# Altium footprint library 全库.PcbLib: 967 footprints (part 16 of 61)
Each footprint in its own frame and in the unit in brackets; x right, y up, seen from the top. Pads: shape width x height; smd on the part's side, far side on the other; paste and mask are expansions set on the pad; w line width, h text height; cw(c..) or ccw(c..) is an arc to the next point about the centre after c.
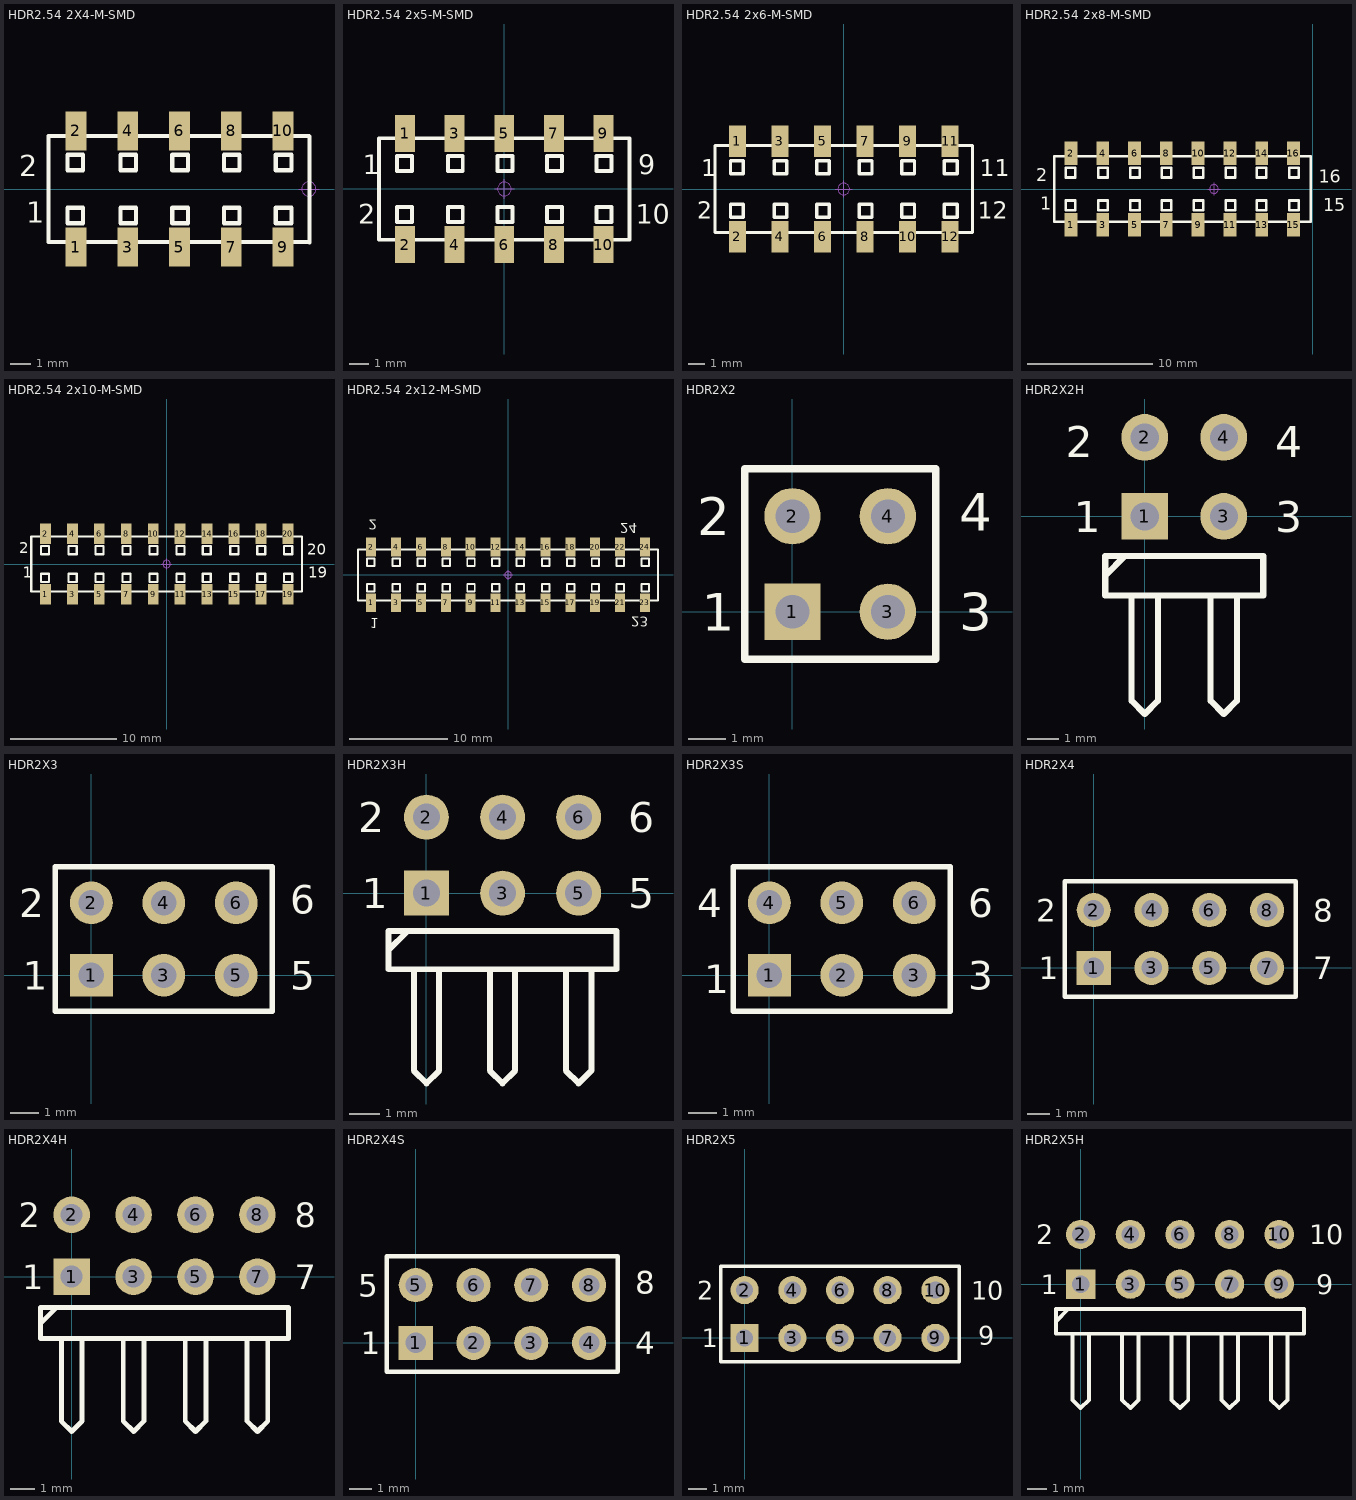
[diagram p15: the footprints below, top view; thin cyan lines are the x and y axes]

## HDR2.54 2X4-M-SMD [mm]
pads (10):
  rect 1.02x1.9 smd: 1(-19.304,-2.85) 2(-19.304,2.85) 3(-16.764,-2.85) 4(-16.764,2.85) 5(-14.224,-2.85) 6(-14.224,2.85) 7(-11.684,-2.85) 8(-11.684,2.85) 9(-9.144,-2.85) 10(-9.144,2.85)
Top Overlay:
  lines w0.2: -7.874,-2.6 -20.644,-2.6 -20.644,2.6 -7.874,2.6 ; -7.842,-2.625 -7.842,2.575 ; -19.715,-1.681 -19.715,-0.919 -18.953,-0.919 -18.953,-1.681 -19.715,-1.681 ; -19.715,0.919 -19.715,1.681 -18.953,1.681 -18.953,0.919 -19.715,0.919 ; -17.115,-1.681 -17.115,-0.919 -16.353,-0.919 -16.353,-1.681 -17.115,-1.681 ; -17.115,0.919 -17.115,1.681 -16.353,1.681 -16.353,0.919 -17.115,0.919 ; -14.575,-1.681 -13.813,-1.681 -13.813,-0.919 -14.575,-0.919 -14.575,-1.681 ; -14.575,0.919 -13.813,0.919 -13.813,1.681 -14.575,1.681 -14.575,0.919 ; -12.035,-1.681 -12.035,-0.919 -11.273,-0.919 -11.273,-1.681 -12.035,-1.681 ; -12.035,0.919 -12.035,1.681 -11.273,1.681 -11.273,0.919 -12.035,0.919 ; -9.495,-1.681 -9.495,-0.919 -8.733,-0.919 -8.733,-1.681 -9.495,-1.681 ; -9.495,0.919 -9.495,1.681 -8.733,1.681 -8.733,0.919 -9.495,0.919
  text "1" at -21.748,-1.665 h1.02
  text "2" at -22.098,0.635 h1.02
Mechanical 15:
  circle w0.05: c-7.874,0 r0.35
  lines w0.05: -8.374,0 -7.374,0 ; -7.874,-0.5 -7.874,0.5
3D body "HDR2.54 2x1P_M.STEP": height 5.15, standoff 0, extent -15.524,-3.2 -12.924,3.2
3D body "HDR2.54 2x1P_M.STEP": height 5.15, standoff 0, extent -18.064,-3.2 -15.464,3.2
3D body "HDR2.54 2x1P_M.STEP": height 5.15, standoff 0, extent -20.604,-3.2 -18.004,3.2
3D body "HDR2.54 2x1P_M.STEP": height 5.15, standoff 0, extent -12.984,-3.2 -10.384,3.2
3D body "HDR2.54 2x1P_M.STEP": height 5.15, standoff 0, extent -10.444,-3.2 -7.844,3.2

## HDR2.54 2x5-M-SMD [mm] "脚距：2.54mm，贴片双排母"
pads (10):
  rect 1.02x1.9 smd: 1(-5.08,2.85) 2(-5.08,-2.85) 3(-2.54,2.85) 4(-2.54,-2.85) 5(0,2.85) 6(0,-2.85) 7(2.54,2.85) 8(2.54,-2.85) 9(5.08,2.85) 10(5.08,-2.85)
Top Overlay:
  lines w0.2: -6.42,-2.6 -6.42,2.6 6.41,2.6 6.41,-2.6 -6.42,-2.6 ; -5.491,-1.681 -4.729,-1.681 -4.729,-0.919 -5.491,-0.919 -5.491,-1.681 ; -5.491,0.919 -4.729,0.919 -4.729,1.681 -5.491,1.681 -5.491,0.919 ; -2.891,-1.681 -2.129,-1.681 -2.129,-0.919 -2.891,-0.919 -2.891,-1.681 ; -2.891,0.919 -2.129,0.919 -2.129,1.681 -2.891,1.681 -2.891,0.919 ; -0.351,-1.681 -0.351,-0.919 0.411,-0.919 0.411,-1.681 -0.351,-1.681 ; -0.351,0.919 -0.351,1.681 0.411,1.681 0.411,0.919 -0.351,0.919 ; 2.189,-1.681 2.951,-1.681 2.951,-0.919 2.189,-0.919 2.189,-1.681 ; 2.189,0.919 2.951,0.919 2.951,1.681 2.189,1.681 2.189,0.919 ; 4.729,-1.681 5.491,-1.681 5.491,-0.919 4.729,-0.919 4.729,-1.681 ; 4.729,0.919 5.491,0.919 5.491,1.681 4.729,1.681 4.729,0.919
  text "10" at 6.731,-1.778 h1.02
  text "9" at 6.858,0.762 h1.02
  text "2" at -7.493,-1.778 h1.02
  text "1" at -7.239,0.762 h1.02
Mechanical 15:
  circle w0.05: c0,0 r0.35
  lines w0.05: -0.5,0 0.5,0 ; 0,-0.5 0,0.5
3D body "HDR2.54 2x1P_M.STEP": height 5.15, standoff 0, extent 3.78,-3.2 6.38,3.2
3D body "HDR2.54 2x1P_M.STEP": height 5.15, standoff 0, extent 1.24,-3.2 3.84,3.2
3D body "HDR2.54 2x1P_M.STEP": height 5.15, standoff 0, extent -6.38,-3.2 -3.78,3.2
3D body "HDR2.54 2x1P_M.STEP": height 5.15, standoff 0, extent -3.84,-3.2 -1.24,3.2
3D body "HDR2.54 2x1P_M.STEP": height 5.15, standoff 0, extent -1.3,-3.2 1.3,3.2

## HDR2.54 2x6-M-SMD [mm] "脚距：2.54mm，贴片双排母"
pads (12):
  rect 1.02x1.9 smd: 1(-6.35,2.85) 2(-6.35,-2.85) 3(-3.81,2.85) 4(-3.81,-2.85) 5(-1.27,2.85) 6(-1.27,-2.85) 7(1.27,2.85) 8(1.27,-2.85) 9(3.81,2.85) 10(3.81,-2.85) 11(6.35,2.85) 12(6.35,-2.85)
Top Overlay:
  lines w0.2: -7.69,-2.6 -7.69,2.6 7.68,2.6 7.68,-2.6 -7.69,-2.6 ; -6.761,-1.681 -6.761,-0.919 -5.999,-0.919 -5.999,-1.681 -6.761,-1.681 ; -6.761,0.919 -6.761,1.681 -5.999,1.681 -5.999,0.919 -6.761,0.919 ; -4.161,-1.681 -4.161,-0.919 -3.399,-0.919 -3.399,-1.681 -4.161,-1.681 ; -4.161,0.919 -4.161,1.681 -3.399,1.681 -3.399,0.919 -4.161,0.919 ; -1.621,-1.681 -0.859,-1.681 -0.859,-0.919 -1.621,-0.919 -1.621,-1.681 ; -1.621,0.919 -0.859,0.919 -0.859,1.681 -1.621,1.681 -1.621,0.919 ; 0.919,-1.681 0.919,-0.919 1.681,-0.919 1.681,-1.681 0.919,-1.681 ; 0.919,0.919 0.919,1.681 1.681,1.681 1.681,0.919 0.919,0.919 ; 3.459,-1.681 3.459,-0.919 4.221,-0.919 4.221,-1.681 3.459,-1.681 ; 3.459,0.919 3.459,1.681 4.221,1.681 4.221,0.919 3.459,0.919 ; 5.999,-1.681 5.999,-0.919 6.761,-0.919 6.761,-1.681 5.999,-1.681 ; 5.999,0.919 5.999,1.681 6.761,1.681 6.761,0.919 5.999,0.919
  text "12" at 8.001,-1.778 h1.02
  text "11" at 8.128,0.762 h1.02
  text "1" at -8.509,0.762 h1.02
  text "2" at -8.763,-1.778 h1.02
Mechanical 15:
  circle w0.05: c0,0 r0.35
  lines w0.05: -0.5,0 0.5,0 ; 0,-0.5 0,0.5
3D body "HDR2.54 2x1P_M.STEP": height 5.15, standoff 0, extent -2.57,-3.2 0.03,3.2
3D body "HDR2.54 2x1P_M.STEP": height 5.15, standoff 0, extent -5.11,-3.2 -2.51,3.2
3D body "HDR2.54 2x1P_M.STEP": height 5.15, standoff 0, extent -7.65,-3.2 -5.05,3.2
3D body "HDR2.54 2x1P_M.STEP": height 5.15, standoff 0, extent -0.03,-3.2 2.57,3.2
3D body "HDR2.54 2x1P_M.STEP": height 5.15, standoff 0, extent 2.51,-3.2 5.11,3.2
3D body "HDR2.54 2x1P_M.STEP": height 5.15, standoff 0, extent 5.05,-3.2 7.65,3.2

## HDR2.54 2x8-M-SMD [mm]
pads (16):
  rect 1.02x1.9 smd: 1(-19.304,-2.85) 2(-19.304,2.85) 3(-16.764,-2.85) 4(-16.764,2.85) 5(-14.224,-2.85) 6(-14.224,2.85) 7(-11.684,-2.85) 8(-11.684,2.85) 9(-9.144,-2.85) 10(-9.144,2.85) 11(-6.604,-2.85) 12(-6.604,2.85) 13(-4.064,-2.85) 14(-4.064,2.85) 15(-1.524,-2.85) 16(-1.524,2.85)
Top Overlay:
  lines w0.2: -20.644,-2.6 -20.644,2.6 -0.127,2.6 -0.127,-2.6 -20.644,-2.6 ; -19.715,-1.681 -18.953,-1.681 -18.953,-0.919 -19.715,-0.919 -19.715,-1.681 ; -19.715,0.919 -18.953,0.919 -18.953,1.681 -19.715,1.681 -19.715,0.919 ; -17.115,-1.681 -16.353,-1.681 -16.353,-0.919 -17.115,-0.919 -17.115,-1.681 ; -17.115,0.919 -16.353,0.919 -16.353,1.681 -17.115,1.681 -17.115,0.919 ; -14.575,-1.681 -14.575,-0.919 -13.813,-0.919 -13.813,-1.681 -14.575,-1.681 ; -14.575,0.919 -14.575,1.681 -13.813,1.681 -13.813,0.919 -14.575,0.919 ; -12.035,-1.681 -11.273,-1.681 -11.273,-0.919 -12.035,-0.919 -12.035,-1.681 ; -12.035,0.919 -11.273,0.919 -11.273,1.681 -12.035,1.681 -12.035,0.919 ; -9.495,-1.681 -8.733,-1.681 -8.733,-0.919 -9.495,-0.919 -9.495,-1.681 ; -9.495,0.919 -8.733,0.919 -8.733,1.681 -9.495,1.681 -9.495,0.919 ; -6.955,-1.681 -6.193,-1.681 -6.193,-0.919 -6.955,-0.919 -6.955,-1.681 ; -6.955,0.919 -6.193,0.919 -6.193,1.681 -6.955,1.681 -6.955,0.919 ; -4.475,-1.681 -4.475,-0.919 -3.713,-0.919 -3.713,-1.681 -4.475,-1.681 ; -4.475,0.919 -4.475,1.681 -3.713,1.681 -3.713,0.919 -4.475,0.919 ; -1.875,-1.681 -1.875,-0.919 -1.113,-0.919 -1.113,-1.681 -1.875,-1.681 ; -1.875,0.919 -1.875,1.681 -1.113,1.681 -1.113,0.919 -1.875,0.919
  text "15" at 0.858,-1.792 h1.02
  text "16" at 0.508,0.508 h1.02
  text "2" at -22.098,0.635 h1.02
  text "1" at -21.748,-1.665 h1.02
Mechanical 15:
  circle w0.05: c-7.874,0 r0.35
  lines w0.05: -8.374,0 -7.374,0 ; -7.874,-0.5 -7.874,0.5
3D body "HDR2.54 2x1P_M.STEP": height 5.15, standoff 0, extent -2.824,-3.2 -0.224,3.2
3D body "HDR2.54 2x1P_M.STEP": height 5.15, standoff 0, extent -5.364,-3.2 -2.764,3.2
3D body "HDR2.54 2x1P_M.STEP": height 5.15, standoff 0, extent -7.904,-3.2 -5.304,3.2
3D body "HDR2.54 2x1P_M.STEP": height 5.15, standoff 0, extent -10.444,-3.2 -7.844,3.2
3D body "HDR2.54 2x1P_M.STEP": height 5.15, standoff 0, extent -12.984,-3.2 -10.384,3.2
3D body "HDR2.54 2x1P_M.STEP": height 5.15, standoff 0, extent -20.604,-3.2 -18.004,3.2
3D body "HDR2.54 2x1P_M.STEP": height 5.15, standoff 0, extent -18.064,-3.2 -15.464,3.2
3D body "HDR2.54 2x1P_M.STEP": height 5.15, standoff 0, extent -15.524,-3.2 -12.924,3.2

## HDR2.54 2x10-M-SMD [mm] "脚距：2.54mm，贴片双排母"
pads (20):
  rect 1.02x1.9 smd: 1(-11.43,-2.85) 2(-11.43,2.85) 3(-8.89,-2.85) 4(-8.89,2.85) 5(-6.35,-2.85) 6(-6.35,2.85) 7(-3.81,-2.85) 8(-3.81,2.85) 9(-1.27,-2.85) 10(-1.27,2.85) 11(1.27,-2.85) 12(1.27,2.85) 13(3.81,-2.85) 14(3.81,2.85) 15(6.35,-2.85) 16(6.35,2.85) 17(8.89,-2.85) 18(8.89,2.85) 19(11.43,-2.85) 20(11.43,2.85)
Top Overlay:
  lines w0.2: -12.77,-2.6 -12.77,2.6 12.76,2.6 12.76,-2.6 -12.77,-2.6 ; -11.841,-1.681 -11.079,-1.681 -11.079,-0.919 -11.841,-0.919 -11.841,-1.681 ; -11.841,0.919 -11.079,0.919 -11.079,1.681 -11.841,1.681 -11.841,0.919 ; -9.241,-1.681 -8.479,-1.681 -8.479,-0.919 -9.241,-0.919 -9.241,-1.681 ; -9.241,0.919 -8.479,0.919 -8.479,1.681 -9.241,1.681 -9.241,0.919 ; -6.701,-1.681 -6.701,-0.919 -5.939,-0.919 -5.939,-1.681 -6.701,-1.681 ; -6.701,0.919 -6.701,1.681 -5.939,1.681 -5.939,0.919 -6.701,0.919 ; -4.161,-1.681 -3.399,-1.681 -3.399,-0.919 -4.161,-0.919 -4.161,-1.681 ; -4.161,0.919 -3.399,0.919 -3.399,1.681 -4.161,1.681 -4.161,0.919 ; -1.621,-1.681 -0.859,-1.681 -0.859,-0.919 -1.621,-0.919 -1.621,-1.681 ; -1.621,0.919 -0.859,0.919 -0.859,1.681 -1.621,1.681 -1.621,0.919 ; 0.919,-1.681 1.681,-1.681 1.681,-0.919 0.919,-0.919 0.919,-1.681 ; 0.919,0.919 1.681,0.919 1.681,1.681 0.919,1.681 0.919,0.919 ; 3.399,-1.681 3.399,-0.919 4.161,-0.919 4.161,-1.681 3.399,-1.681 ; 3.399,0.919 3.399,1.681 4.161,1.681 4.161,0.919 3.399,0.919 ; 5.999,-1.681 5.999,-0.919 6.761,-0.919 6.761,-1.681 5.999,-1.681 ; 5.999,0.919 5.999,1.681 6.761,1.681 6.761,0.919 5.999,0.919 ; 8.539,-1.681 9.301,-1.681 9.301,-0.919 8.539,-0.919 8.539,-1.681 ; 8.539,0.919 9.301,0.919 9.301,1.681 8.539,1.681 8.539,0.919 ; 11.079,-1.681 11.079,-0.919 11.841,-0.919 11.841,-1.681 11.079,-1.681 ; 11.079,0.919 11.079,1.681 11.841,1.681 11.841,0.919 11.079,0.919
  text "2" at -13.925,1 h1.02
  text "1" at -13.575,-1.3 h1.02
  text "19" at 13.35,-1.3 h1.02
  text "20" at 13.25,0.85 h1.02
Mechanical 15:
  circle w0.05: c0,0 r0.35
  lines w0.05: -0.5,0 0.5,0 ; 0,-0.5 0,0.5
3D body "HDR2.54 2x1P_M.STEP": height 5.15, standoff 0, extent 10.13,-3.2 12.73,3.2
3D body "HDR2.54 2x1P_M.STEP": height 5.15, standoff 0, extent 7.59,-3.2 10.19,3.2
3D body "HDR2.54 2x1P_M.STEP": height 5.15, standoff 0, extent 5.05,-3.2 7.65,3.2
3D body "HDR2.54 2x1P_M.STEP": height 5.15, standoff 0, extent 2.51,-3.2 5.11,3.2
3D body "HDR2.54 2x1P_M.STEP": height 5.15, standoff 0, extent -0.03,-3.2 2.57,3.2
3D body "HDR2.54 2x1P_M.STEP": height 5.15, standoff 0, extent -2.57,-3.2 0.03,3.2
3D body "HDR2.54 2x1P_M.STEP": height 5.15, standoff 0, extent -5.11,-3.2 -2.51,3.2
3D body "HDR2.54 2x1P_M.STEP": height 5.15, standoff 0, extent -12.73,-3.2 -10.13,3.2
3D body "HDR2.54 2x1P_M.STEP": height 5.15, standoff 0, extent -10.19,-3.2 -7.59,3.2
3D body "HDR2.54 2x1P_M.STEP": height 5.15, standoff 0, extent -7.65,-3.2 -5.05,3.2

## HDR2.54 2x12-M-SMD [mm] "脚距：2.54mm，贴片双排母"
pads (24):
  rect 1.02x1.9 smd: 1(-13.97,-2.85) 2(-13.97,2.85) 3(-11.43,-2.85) 4(-11.43,2.85) 5(-8.89,-2.85) 6(-8.89,2.85) 7(-6.35,-2.85) 8(-6.35,2.85) 9(-3.81,-2.85) 10(-3.81,2.85) 11(-1.27,-2.85) 12(-1.27,2.85) 13(1.27,-2.85) 14(1.27,2.85) 15(3.81,-2.85) 16(3.81,2.85) 17(6.35,-2.85) 18(6.35,2.85) 19(8.89,-2.85) 20(8.89,2.85) 21(11.43,-2.85) 22(11.43,2.85) 23(13.97,-2.85) 24(13.97,2.85)
Top Overlay:
  lines w0.2: -15.31,-2.6 -15.31,2.6 15.3,2.6 15.3,-2.6 -15.31,-2.6 ; -14.381,-1.681 -13.619,-1.681 -13.619,-0.919 -14.381,-0.919 -14.381,-1.681 ; -14.381,0.919 -13.619,0.919 -13.619,1.681 -14.381,1.681 -14.381,0.919 ; -11.781,-1.681 -11.019,-1.681 -11.019,-0.919 -11.781,-0.919 -11.781,-1.681 ; -11.781,0.919 -11.019,0.919 -11.019,1.681 -11.781,1.681 -11.781,0.919 ; -9.241,-1.681 -9.241,-0.919 -8.479,-0.919 -8.479,-1.681 -9.241,-1.681 ; -9.241,0.919 -9.241,1.681 -8.479,1.681 -8.479,0.919 -9.241,0.919 ; -6.701,-1.681 -5.939,-1.681 -5.939,-0.919 -6.701,-0.919 -6.701,-1.681 ; -6.701,0.919 -5.939,0.919 -5.939,1.681 -6.701,1.681 -6.701,0.919 ; -4.161,-1.681 -3.399,-1.681 -3.399,-0.919 -4.161,-0.919 -4.161,-1.681 ; -4.161,0.919 -3.399,0.919 -3.399,1.681 -4.161,1.681 -4.161,0.919 ; -1.621,-1.681 -0.859,-1.681 -0.859,-0.919 -1.621,-0.919 -1.621,-1.681 ; -1.621,0.919 -0.859,0.919 -0.859,1.681 -1.621,1.681 -1.621,0.919 ; 0.859,-1.681 0.859,-0.919 1.621,-0.919 1.621,-1.681 0.859,-1.681 ; 0.859,0.919 0.859,1.681 1.621,1.681 1.621,0.919 0.859,0.919 ; 3.459,-1.681 3.459,-0.919 4.221,-0.919 4.221,-1.681 3.459,-1.681 ; 3.459,0.919 3.459,1.681 4.221,1.681 4.221,0.919 3.459,0.919 ; 5.999,-1.681 6.761,-1.681 6.761,-0.919 5.999,-0.919 5.999,-1.681 ; 5.999,0.919 6.761,0.919 6.761,1.681 5.999,1.681 5.999,0.919 ; 8.539,-1.681 8.539,-0.919 9.301,-0.919 9.301,-1.681 8.539,-1.681 ; 8.539,0.919 8.539,1.681 9.301,1.681 9.301,0.919 8.539,0.919 ; 11.079,-1.681 11.079,-0.919 11.841,-0.919 11.841,-1.681 11.079,-1.681 ; 11.079,0.919 11.079,1.681 11.841,1.681 11.841,0.919 11.079,0.919 ; 13.619,-1.681 13.619,-0.919 14.381,-0.919 14.381,-1.681 13.619,-1.681 ; 13.619,0.919 13.619,1.681 14.381,1.681 14.381,0.919 13.619,0.919
  text "2" at -14.235,5.65 h1.02
  text "1" at -14.085,-4.425 h1.02
  text "23" at 12.595,-4.24 h1.02
  text "24" at 11.47,5.26 h1.02
Mechanical 15:
  circle w0.05: c0,0 r0.35
  lines w0.05: -0.5,0 0.5,0 ; 0,-0.5 0,0.5
3D body "HDR2.54 2x1P_M.STEP": height 5.15, standoff 0, extent 12.67,-3.2 15.27,3.2
3D body "HDR2.54 2x1P_M.STEP": height 5.15, standoff 0, extent 10.13,-3.2 12.73,3.2
3D body "HDR2.54 2x1P_M.STEP": height 5.15, standoff 0, extent 7.59,-3.2 10.19,3.2
3D body "HDR2.54 2x1P_M.STEP": height 5.15, standoff 0, extent 5.05,-3.2 7.65,3.2
3D body "HDR2.54 2x1P_M.STEP": height 5.15, standoff 0, extent 2.51,-3.2 5.11,3.2
3D body "HDR2.54 2x1P_M.STEP": height 5.15, standoff 0, extent -0.03,-3.2 2.57,3.2
3D body "HDR2.54 2x1P_M.STEP": height 5.15, standoff 0, extent -2.57,-3.2 0.03,3.2
3D body "HDR2.54 2x1P_M.STEP": height 5.15, standoff 0, extent -5.11,-3.2 -2.51,3.2
3D body "HDR2.54 2x1P_M.STEP": height 5.15, standoff 0, extent -7.65,-3.2 -5.05,3.2
3D body "HDR2.54 2x1P_M.STEP": height 5.15, standoff 0, extent -15.27,-3.2 -12.67,3.2
3D body "HDR2.54 2x1P_M.STEP": height 5.15, standoff 0, extent -12.73,-3.2 -10.13,3.2
3D body "HDR2.54 2x1P_M.STEP": height 5.15, standoff 0, extent -10.19,-3.2 -7.59,3.2

## HDR2X2 [mm]
pads (4):
  rect 1.5x1.5 hole 0.9: 1(0,0)
  round 1.5 hole 0.9: 2(0,2.54) 3(2.54,0) 4(2.54,2.54)
Top Overlay:
  lines w0.2: -1.27,-1.27 -1.27,3.81 3.81,3.81 3.81,-1.27 -1.27,-1.27
  text "1" at -2.413,-0.508 h1
  text "2" at -2.54,2.032 h1
  text "4" at 4.445,2.159 h1
  text "3" at 4.445,-0.508 h1

## HDR2X2H [mm]
pads (4):
  rect 1.5x1.5 hole 0.9: 1(0,0)
  round 1.5 hole 0.9: 2(0,2.54) 3(2.54,0) 4(2.54,2.54)
Top Overlay:
  lines w0.2: -1.27,-1.905 -0.635,-1.27 ; -0.423,-2.54 -0.423,-5.927 0,-6.35 0.423,-5.927 0.423,-2.54 ; 2.117,-2.54 2.117,-5.927 2.54,-6.35 2.963,-5.927 2.963,-2.54 ; -1.27,-2.54 3.81,-2.54 3.81,-1.27 -1.27,-1.27 -1.27,-2.54
  text "3" at 4.191,-0.508 h1
  text "4" at 4.191,1.905 h1
  text "2" at -2.54,1.905 h1
  text "1" at -2.286,-0.508 h1

## HDR2X3 [mm]
pads (6):
  rect 1.5x1.5 hole 0.9: 1(0,0)
  round 1.5 hole 0.9: 2(0,2.54) 3(2.54,0) 4(2.54,2.54) 5(5.08,0) 6(5.08,2.54)
Top Overlay:
  lines w0.2: 1.482,-1.27 6.35,-1.27 ; 6.35,-1.27 6.35,3.81 -1.27,3.81 -1.27,-1.27 6.35,-1.27
  text "6" at 6.985,2.159 h1
  text "5" at 6.985,-0.508 h1
  text "2" at -2.54,2.032 h1
  text "1" at -2.413,-0.508 h1

## HDR2X3H [mm]
pads (6):
  rect 1.5x1.5 hole 0.9: 1(0,0)
  round 1.5 hole 0.9: 2(0,2.54) 3(2.54,0) 4(2.54,2.54) 5(5.08,0) 6(5.08,2.54)
Top Overlay:
  lines w0.2: -1.27,-1.905 -0.635,-1.27 ; -0.423,-2.54 -0.423,-5.927 0,-6.35 0.423,-5.927 0.423,-2.54 ; 2.117,-2.54 2.117,-5.927 2.54,-6.35 2.963,-5.927 2.963,-2.54 ; 4.657,-2.54 4.657,-5.927 5.08,-6.35 5.503,-5.927 5.503,-2.54 ; -1.27,-2.54 6.35,-2.54 6.35,-1.27 -1.27,-1.27 -1.27,-2.54
  text "2" at -2.286,2.032 h1
  text "1" at -2.159,-0.508 h1
  text "5" at 6.731,-0.508 h1
  text "6" at 6.731,2.032 h1

## HDR2X3S [mm]
pads (6):
  rect 1.5x1.5 hole 0.9: 1(0,0)
  round 1.5 hole 0.9: 2(2.54,0) 3(5.08,0) 4(0,2.54) 5(2.54,2.54) 6(5.08,2.54)
Top Overlay:
  lines w0.2: -1.27,-1.27 6.35,-1.27 6.35,3.81 -1.27,3.81 -1.27,-1.27
  text "6" at 6.985,2.032 h1
  text "3" at 6.985,-0.508 h1
  text "1" at -2.286,-0.635 h1
  text "4" at -2.54,2.032 h1

## HDR2X4 [mm]
pads (8):
  rect 1.5x1.5 hole 0.9: 1(0,0)
  round 1.5 hole 0.9: 2(0,2.54) 3(2.54,0) 4(2.54,2.54) 5(5.08,0) 6(5.08,2.54) 7(7.62,0) 8(7.62,2.54)
Top Overlay:
  lines w0.2: -1.27,-1.27 8.89,-1.27 8.89,3.81 -1.27,3.81 -1.27,-1.27
  text "2" at -2.54,2.032 h1
  text "1" at -2.413,-0.508 h1
  text "7" at 9.652,-0.508 h1
  text "8" at 9.652,2.032 h1

## HDR2X4H [mm]
pads (8):
  rect 1.5x1.5 hole 0.9: 1(0,0)
  round 1.5 hole 0.9: 2(0,2.54) 3(2.54,0) 4(2.54,2.54) 5(5.08,0) 6(5.08,2.54) 7(7.62,0) 8(7.62,2.54)
Top Overlay:
  lines w0.2: -1.27,-1.905 -0.635,-1.27 ; -0.423,-2.54 -0.423,-5.927 0,-6.35 0.423,-5.927 0.423,-2.54 ; 2.117,-2.54 2.117,-5.927 2.54,-6.35 2.963,-5.927 2.963,-2.54 ; 4.657,-2.54 4.657,-5.927 5.08,-6.35 5.503,-5.927 5.503,-2.54 ; 7.197,-2.54 7.197,-5.927 7.62,-6.35 8.043,-5.927 8.043,-2.54 ; -1.27,-2.54 -1.27,-1.27 8.89,-1.27 8.89,-2.54 -1.27,-2.54
  text "8" at 9.144,2.032 h1
  text "7" at 9.144,-0.508 h1
  text "1" at -2.032,-0.508 h1
  text "2" at -2.159,2.032 h1

## HDR2X4S [mm]
pads (8):
  rect 1.5x1.5 hole 0.9: 1(0,0)
  round 1.5 hole 0.9: 2(2.54,0) 3(5.08,0) 4(7.62,0) 5(0,2.54) 6(2.54,2.54) 7(5.08,2.54) 8(7.62,2.54)
Top Overlay:
  lines w0.2: -1.27,-1.27 -1.27,3.81 8.89,3.81 8.89,-1.27 -1.27,-1.27
  text "8" at 9.652,2.159 h1
  text "4" at 9.652,-0.508 h1
  text "1" at -2.413,-0.508 h1
  text "5" at -2.54,2.032 h1

## HDR2X5 [mm]
pads (10):
  rect 1.5x1.5 hole 0.9: 1(0,0)
  round 1.5 hole 0.9: 2(0,2.54) 3(2.54,0) 4(2.54,2.54) 5(5.08,0) 6(5.08,2.54) 7(7.62,0) 8(7.62,2.54) 9(10.16,0) 10(10.16,2.54)
Top Overlay:
  lines w0.2: -1.27,-1.27 -1.27,3.81 11.43,3.81 11.43,-1.27 -1.27,-1.27
  text "2" at -2.54,2.032 h1
  text "1" at -2.286,-0.508 h1
  text "9" at 12.446,-0.381 h1
  text "10" at 12.065,2.032 h1

## HDR2X5H [mm]
pads (10):
  rect 1.5x1.5 hole 0.9: 1(0,0)
  round 1.5 hole 0.9: 2(0,2.54) 3(2.54,0) 4(2.54,2.54) 5(5.08,0) 6(5.08,2.54) 7(7.62,0) 8(7.62,2.54) 9(10.16,0) 10(10.16,2.54)
Top Overlay:
  lines w0.2: -1.27,-1.905 -0.635,-1.27 ; -0.423,-2.54 -0.423,-5.927 0,-6.35 0.423,-5.927 0.423,-2.54 ; 2.117,-2.54 2.117,-5.927 2.54,-6.35 2.963,-5.927 2.963,-2.54 ; 4.657,-2.54 4.657,-5.927 5.08,-6.35 5.503,-5.927 5.503,-2.54 ; 7.197,-2.54 7.197,-5.927 7.62,-6.35 8.043,-5.927 8.043,-2.54 ; 9.737,-2.54 9.737,-5.927 10.16,-6.35 10.583,-5.927 10.583,-2.54 ; -1.27,-2.54 -1.27,-1.27 11.43,-1.27 11.43,-2.54 -1.27,-2.54
  text "10" at 11.684,2.032 h1
  text "9" at 12.065,-0.508 h1
  text "1" at -2.032,-0.508 h1
  text "2" at -2.286,2.032 h1